# Altium footprint library bethu.PcbLib: 628 footprints (part 38 of 40)
Each footprint in its own frame and in the unit in brackets; x right, y up, seen from the top. Pads: shape width x height; smd on the part's side, far side on the other; paste and mask are expansions set on the pad; w line width, h text height; cw(c..) or ccw(c..) is an arc to the next point about the centre after c.
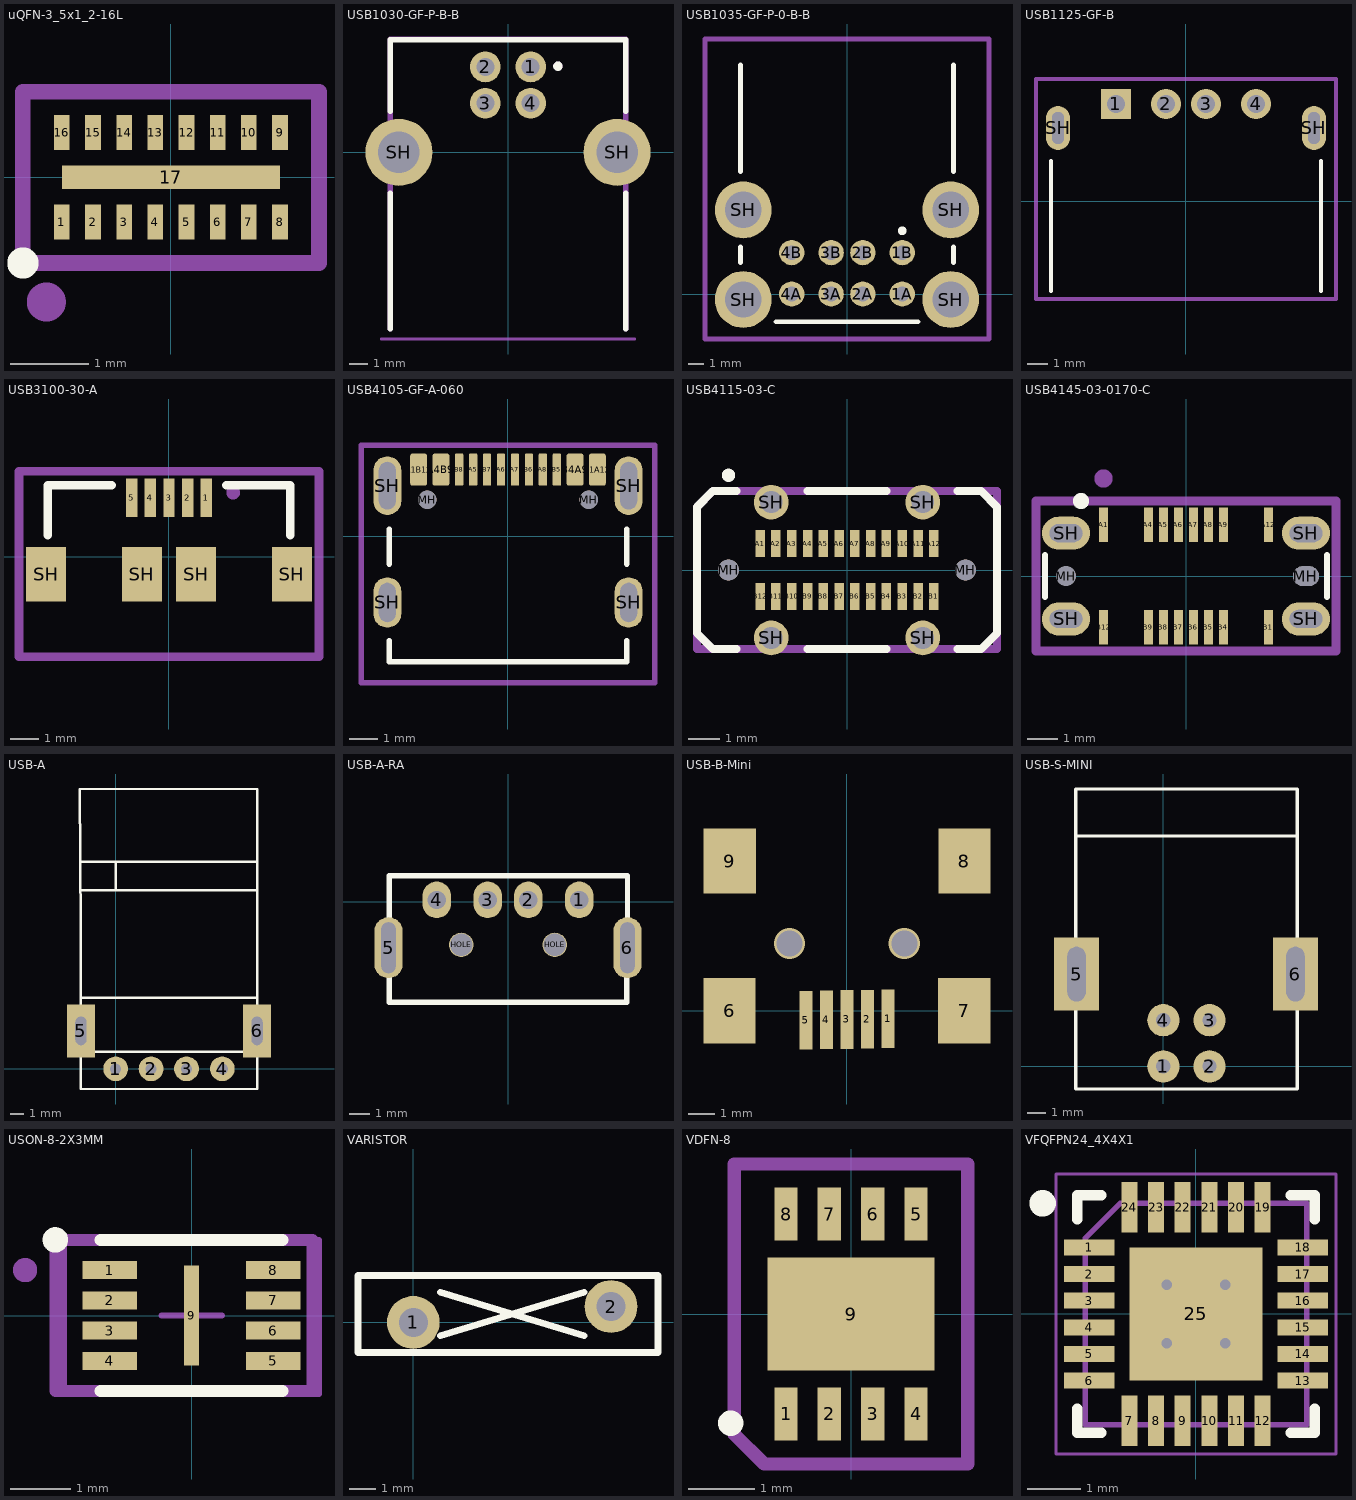
[diagram p37: the footprints below, top view; thin cyan lines are the x and y axes]

## uQFN-3_5x1_2-16L [mm]
pads (17):
  rect 0.2x0.45 smd: 1(-1.4,-0.575) 2(-1,-0.575) 3(-0.6,-0.575) 4(-0.2,-0.575) 5(0.2,-0.575) 6(0.6,-0.575) 7(1,-0.575) 8(1.4,-0.575) 9(1.4,0.575) 10(1,0.575) 11(0.6,0.575) 12(0.2,0.575) 13(-0.2,0.575) 14(-0.6,0.575) 15(-1,0.575) 16(-1.4,0.575)
  rect 2.8x0.3 smd: 17(0,0)
Top Overlay:
  circle w0.3: c-1.9,-1.1 r0.05
Mechanical 13:
  circle w0.3: c-1.6,-1.6 r0.1
  lines w0.2: -1.9,-1.1 1.9,-1.1 1.9,1.1 -1.9,1.1 -1.9,-1.1
  text "'.Designator'" at -5.665,-0.417 h1
3D body "EMIF06-MSD02N16.stp": height 0.56, standoff 0.01, extent -1.75,-0.6 1.75,0.6

## USB1030-GF-P-B-B [mm]
pads (6):
  round 1.7 hole 1: 1(1.25,4.71) 2(-1.25,4.71) 3(-1.25,2.71) 4(1.25,2.71)
  round 3.7 hole 2.3: SH(-6.02,0) SH(6.02,0)
Top Overlay:
  circle w0.3: c2.75,4.75 r0.104
  lines w0.3: -6.5,-9.75 -6.5,-2.25 ; -6.5,2.25 -6.5,6.2 6.5,6.2 6.5,2.25 ; 6.5,-9.75 6.5,-2.25
Mechanical 13:
  circle w0.3: c2.75,4.75 r0.099
  lines w0.15: -7,-10.3 7,-10.3
  lines w0.3: -6.5,-9.75 -6.5,6.25 6.5,6.25 6.5,-9.75
  text "'.Designator'" at -5.815,-0.9 h1
  text "PCB EDGE" at -2.032,-10.1 h0.5
3D body "USB1030-15-P-B-B.stp": height 10.96, standoff -3.48, extent -7.067,-10.3 7.043,5.9

## USB1035-GF-P-0-B-B [mm]
pads (12):
  round 1.6 hole 0.92: 1A(3.5,0) 1B(3.5,2.62) 2A(1,0) 2B(1,2.62) 3A(-1,0) 3B(-1,2.62) 4A(-3.5,0) 4B(-3.5,2.62)
  round 3.6 hole 2.3: SH(-6.57,-0.35) SH(-6.57,5.33) SH(6.57,-0.35) SH(6.57,5.33)
Top Overlay:
  circle w0.3: c3.5,4 r0.125
  lines w0.3: -6.75,2 -6.75,3 ; -6.75,7.75 -6.75,14.5 ; -4.5,-1.75 4.5,-1.75 ; 6.75,2 6.75,3 ; 6.75,7.75 6.75,14.5
Mechanical 13:
  circle w0.3: c3.5,4 r0.09
  lines w0.3: -9,-2.85 0,-2.85 9,-2.85 9,16.15 -9,16.15 -9,-2.85
  text "'.Designator'" at -5.665,10.083 h1
3D body "USB1035-15-P-0-B-B.stp": height 16.18, standoff -3.82, extent -7.864,-1.4 7.86,15.6

## USB1125-GF-B [mm]
pads (6):
  rect 1.5x1.5 hole 0.92 mask+0.07: 1(-3.5,4.85)
  round 1.5 hole 0.92 mask+0.07: 2(-1,4.85) 3(1,4.85) 4(3.5,4.85)
  oval 1.2x2.2 hole 0.6 slot 1.6 at 90 deg mask+0.07: SH(-6.4,3.65) SH(6.4,3.65)
Top Overlay:
  lines w0.2: -6.75,-4.5 -6.75,2 ; 6.75,-4.5 6.75,2
Mechanical 13:
  lines w0.2: -7.5,-4.9 -7.5,6.1 7.5,6.1 7.5,-4.9 6.75,-4.9 -6.75,-4.9 -7.5,-4.9
  text "PCB EDGE" at -2.634,-4.725 h0.6
  text "'.Designator'" at -5.84,-0.575 h1
3D body "USB1125-GF-B.stp": height 6.49, standoff -2.52, extent -6.55,-4.9 6.55,5.1

## USB3100-30-A [mm]
pads (9):
  rect 0.4x1.35 smd mask+0.15: 1(1.3,2.063) 2(0.65,2.063) 3(0,2.063) 4(-0.65,2.063) 5(-1.3,2.063)
  rect 1.4x1.9 smd: SH(-4.3,-0.613) SH(4.3,-0.613)
  rect 1.4x1.9 smd mask+0.3: SH(-0.95,-0.613) SH(0.95,-0.613)
Top Overlay:
  lines w0.3: -4.25,0.75 -4.25,2.5 -2,2.5 ; 2,2.5 4.25,2.5 4.25,0.75
Mechanical 13:
  circle w0.254: c2.25,2.25 r0.113
  lines w0.3: -5.25,-3.5 -5.25,3 5.25,3 5.25,-3.5 -5.25,-3.5
  text "'.Designator'" at -5.665,-0.417 h1
3D body "usb3100_30_a.stp": height 2.69, standoff -0.12, extent -4.613,-3.337 4.613,2.163

## USB4105-GF-A-060 [mm]
pads (18):
  rrect25% 0.6x1.15 smd mask+0.05: A1B12(-3.2,2.378) A4B9(-2.4,2.378) B1A12(3.2,2.378) B4A9(2.4,2.378)
  rrect25% 0.3x1.15 smd mask+0.05: A5(-1.25,2.378) A6(-0.25,2.378) A7(0.25,2.378) A8(1.25,2.378) B5(1.75,2.378) B6(0.75,2.378) B7(-0.75,2.378) B8(-1.75,2.378)
  round 0.65 hole 0.65 unplated mask+0.05: MH(-2.89,1.303) MH(2.89,1.303)
  oval 1x1.8 hole 0.6 slot 1.4 at 90 deg: SH(-4.32,-2.377) SH(4.32,-2.377)
  oval 1x2.1 hole 0.6 slot 1.7 at 90 deg: SH(-4.32,1.803) SH(4.32,1.803)
Top Overlay:
  lines w0.2: -4.25,-3.75 -4.25,-4.5 4.25,-4.5 4.25,-3.75 ; -4.25,-1 -4.25,0.25 ; 4.25,-1 4.25,0.25
Mechanical 13:
  lines w0.2: -5.25,-5.25 5.25,-5.25 5.25,3.25 -5.25,3.25 -5.25,-3 -5.25,-5.25
  text "'.Designator'" at -5.84,-0.925 h1
3D body "USB4105-GF-A-060.stp": height 3.27, standoff -0.61, extent -4.47,-4.972 4.47,2.728

## USB4115-03-C [mm]
pads (30):
  rect 0.3x0.85 smd: A1(-2.75,0.835) A2(-2.25,0.835) A3(-1.75,0.835) A4(-1.25,0.835) A5(-0.75,0.835) A6(-0.25,0.835) A7(0.25,0.835) A8(0.75,0.835) A9(1.25,0.835) A10(1.75,0.835) A11(2.25,0.835) A12(2.75,0.835) B1(2.75,-0.835) B2(2.25,-0.835) B3(1.75,-0.835) B4(1.25,-0.835) B5(0.75,-0.835) B6(0.25,-0.835) B7(-0.25,-0.835) B8(-0.75,-0.835) B9(-1.25,-0.835) B10(-1.75,-0.835) B11(-2.25,-0.835) B12(-2.75,-0.835)
  round 0.66 hole 0.66 unplated: MH(-3.75,0) MH(3.75,0)
  round 1.1 hole 0.7: SH(-2.4,-2.15) SH(-2.4,2.15) SH(2.4,-2.15) SH(2.4,2.15)
Top Overlay:
  circle w0.254: c-3.75,3 r0.082
  lines w0.254: -3.5,-2.5 -4.25,-2.5 -4.75,-2 -4.75,2 -4.25,2.5 -3.5,2.5 ; -1.25,-2.5 1.25,-2.5 ; -1.25,2.5 1.25,2.5 ; 3.5,-2.5 4.25,-2.5 4.75,-2 4.75,2 4.25,2.5 3.5,2.5
Mechanical 13:
  lines w0.254: -4.75,-2.5 -4.75,2 -4.25,2.5 4.75,2.5 4.75,-2.5 -4.75,-2.5
  text "'.Designator'" at -5.665,-0.417 h1
3D body "USB4115-03-C.stp": height 9.33, standoff -1.07, extent -4.47,-2.3 4.47,2.3

## USB4145-03-0170-C [mm]
pads (22):
  rect 0.3x1.15 smd: A1(-2.75,1.71) A4(-1.25,1.71) A5(-0.75,1.71) A6(-0.25,1.71) A7(0.25,1.71) A8(0.75,1.71) A9(1.25,1.71) A12(2.75,1.71) B1(2.75,-1.71) B4(1.25,-1.71) B5(0.75,-1.71) B6(0.25,-1.71) B7(-0.25,-1.71) B8(-0.75,-1.71) B9(-1.25,-1.71) B12(-2.75,-1.71)
  round 0.66 hole 0.66 unplated: MH(-4,0)
  oval 0.86x0.66 hole 0.66 slot 0.86 at 0 deg unplated: MH(4,0)
  oval 1.6x1.1 hole 0.6 slot 1.1 at 0 deg: SH(-4,-1.43) SH(-4,1.43) SH(4,-1.43) SH(4,1.43)
Top Overlay:
  circle w0.5: c-3.5,2.5 r0.022
  lines w0.2: -4.7,-0.7 -4.7,0.7 ; 4.7,-0.7 4.7,0.7
Mechanical 13:
  circle w0.5: c-2.75,3.25 r0.055
  lines w0.3: -5,-2.5 5,-2.5 5,2.5 -5,2.5 -5,-2.5
  text "'.Designator'" at -5.815,-0.9 h1
3D body "USB4145-03-0170-C.stp": height 7.47, standoff -1.69, extent -4.47,-1.855 4.475,1.835

## USB-A [mil]
pads (6):
  round 70 hole 31: 1(0,0) 2(100,0) 3(200,0) 4(301,0)
  rect 80x150 hole 31 slot 80 at 90 deg: 5(-98,107) 6(399,107)
Top Overlay:
  lines w7: -99,200 400,200 ; -99,504 400,504 ; -99,584 400,584 ; -98,48 401,48 ; 0,504 0,584 ; -101.03,790 -99,397 -99,-57 400,-57 400,790 -101.03,790
3D body "usb_a-usb_a-lp-c.stp": height 177.17, standoff -51.16, extent -97.29,-0.22 399,784.22

## USB-A-RA [mm] "USB Type A"
pads (8):
  oval 1.4x1.8 hole 0.9: 1(3.5,0.08) 2(1,0.08) 3(-1,0.08) 4(-3.5,0.08)
  oval 1.4x3 hole 0.7 slot 2.5 at 90 deg: 5(-5.875,-2.27) 6(5.875,-2.27)
  round 1.2 hole 1.1: HOLE(-2.3,-2.13) HOLE(2.3,-2.13)
Top Overlay:
  lines w0.254: 5.842,-2.27 5.842,-4.953 -5.842,-4.953 -5.842,1.27 5.875,1.27 5.875,-2.27
Keep-Out Layer:
  lines w0.254: 5.842,-2.27 5.875,-2.27
3D body "Samtec-USB-AM-S-F-B-TH-FlashDrive.step": height 2.18, standoff -3.52, extent -6.25,-19.8 6.25,0.23

## USB-B-Mini [mm]
pads (9):
  rect 0.5x2.25 smd: 1(1.575,-0.305) 2(0.787,-0.318) 3(0,-0.33) 4(-0.787,-0.343) 5(-1.575,-0.356)
  rect 2x2.5 smd: 6(-4.5,0) 7(4.5,0) 8(4.504,5.74) 9(-4.496,5.74)
via -2.2,2.58 diameter 1.2 hole 1
via 2.2,2.58 diameter 1.2 hole 1
3D body "User Library-USB_mini_B.step": height 3.95, standoff -1, extent -5.35,-0.673 5.35,8.527

## USB-S-MINI [mil] "USB B connector, 4pin, For Print"
height 100
pads (6):
  round 70 hole 31: 1(0,0) 2(100,0) 3(100,100) 4(0,100)
  rect 98.43x157.48 hole 39.37 slot 118.11 at 90 deg: 5(-188.19,200) 6(286.18,200)
Top Overlay:
  lines w7: -190,499 290,499 ; -190,-49 290,-49 290,601 -190,601 -190,-49
3D body "usb_a-usbsb.stp": height 421.26, standoff -155.51, extent -243.31,-39.61 343.31,610

## USON-8-2X3MM [mm]
height 0.6
pads (9):
  rect 0.9x0.3 smd mask+0.13: 1(-1.35,0.75) 2(-1.35,0.25) 3(-1.35,-0.25) 4(-1.35,-0.75) 5(1.35,-0.75) 6(1.35,-0.25) 7(1.35,0.25) 8(1.35,0.75)
  rect 0.25x1.65 smd paste-0.1: 9(0,0)
Top Overlay:
  circle w0.22: c-2.25,1.25 r0.1
  lines w0.2: -1.5,-1.25 1.5,-1.25 ; -1.5,1.25 1.5,1.25
Top Paste:
  rectangle: -0.1,-0.8 0.1,0.8
Mechanical 13:
  circle w0.2: c-2.75,0.75 r0.1
  lines w0.2: -2.25,-1.25 -2.25,1.25 2,1.25 2,-1.25 -2.25,-1.25
  text "'.Designator'" at -5.815,-0.9 h1
Mechanical 15:
  lines w0.1: -0.5,0 0.5,0 ; 0,-0.5 0,0.5 ; -2.105,-1.3 -2.105,1.25 2.105,1.25 2.105,-1.3 -2.105,-1.3
3D body "USON_8L_2X3_ISSI.step": height 0.61, standoff 0, extent -1.549,-1.054 1.549,1.054

## VARISTOR [mm]
pads (2):
  round 2 hole 1.1: 1(0,0) 2(7.493,0.6)
Top Overlay:
  lines w0.254: 1.016,-0.508 6.477,1.143 ; 1.016,1.143 6.477,-0.508 ; -2.095,-1.143 -2.095,1.778 9.271,1.778 9.271,-1.143 -2.095,-1.143
3D body "User Library-final MOV7,5.STEP": height 16.5, standoff -2, extent -2.095,-0.635 9.207,1.215

## VDFN-8 [mm]
pads (9):
  rect 0.35x0.8 smd mask+0.07: 1(-0.975,-1.5) 2(-0.325,-1.5) 3(0.325,-1.5) 4(0.975,-1.5) 5(0.975,1.5) 6(0.325,1.5) 7(-0.325,1.5) 8(-0.975,1.5)
  rect 2.5x1.7 smd mask+0.07: 9(0,0)
Top Overlay:
  circle w0.25: c-1.807,-1.637 r0.065
Mechanical 13:
  lines w0.2: -1.75,-1.802 -1.75,-0.75 -1.75,2.25 1.75,2.25 1.75,-2.25 -1.302,-2.25 -1.75,-1.802
  text "'.Designator'" at -4.682,-0.75 h0.8
3D body "VDFN-8.step": height 0.9, standoff 0, extent -1.495,-1.5 1.495,1.5

## VFQFPN24_4X4X1 [mm] "QFN, 24-Leads, Body 4,00x4,00mm, Pitch 0,50mm, Thermal Pad 2,50x2,50mm, IPC Medium Density"
height 1
pads (25):
  rect 0.95x0.3 smd mask+0.07: 1(-2,1.25) 2(-2,0.75) 3(-2,0.25) 4(-2,-0.25) 5(-2,-0.75) 6(-2,-1.25) 13(2,-1.25) 14(2,-0.75) 15(2,-0.25) 16(2,0.25) 17(2,0.75) 18(2,1.25)
  rect 0.3x0.95 smd mask+0.07: 7(-1.25,-2) 8(-0.75,-2) 9(-0.25,-2) 10(0.25,-2) 11(0.75,-2) 12(1.25,-2) 19(1.25,2) 20(0.75,2) 21(0.25,2) 22(-0.25,2) 23(-0.75,2) 24(-1.25,2)
  rect 2.5x2.5 smd mask+0.102: 25(0,0)
via -0.55,0.55 diameter 0.5 hole 0.2
via 0.55,0.55 diameter 0.5 hole 0.2
via -0.55,-0.55 diameter 0.5 hole 0.2
via 0.55,-0.55 diameter 0.5 hole 0.2
Top Overlay:
  circle w0.25: c-2.875,2.075 r0.125
  lines w0.2: -2.225,-1.775 -2.225,-2.225 -1.775,-2.225 ; -2.225,1.775 -2.225,2.225 -1.775,2.225 ; 1.775,-2.225 2.225,-2.225 2.225,-1.775 ; 1.775,2.225 2.225,2.225 2.225,1.775
Mechanical 13:
  lines w0.1: -2.075,-2.075 -2.075,1.425 -1.425,2.075 2.075,2.075 2.075,-2.075 -2.075,-2.075
Mechanical 15:
  lines w0.05: -2.625,-2.625 -2.625,2.625 2.625,2.625 2.625,-2.625 -2.625,-2.625
  lines w0.1: -0.5,0 0.5,0 ; 0,-0.5 0,0.5
3D body "VFQFPN24_4X4X1.step": height 0.99, standoff 0, extent -2.07,-2.07 2.07,2.07